# Altium footprint library 2.52-直插元件.PcbLib: 467 footprints (part 11 of 30)
Each footprint in its own frame and in the unit in brackets; x right, y up, seen from the top. Pads: shape width x height; smd on the part's side, far side on the other; paste and mask are expansions set on the pad; w line width, h text height; cw(c..) or ccw(c..) is an arc to the next point about the centre after c.
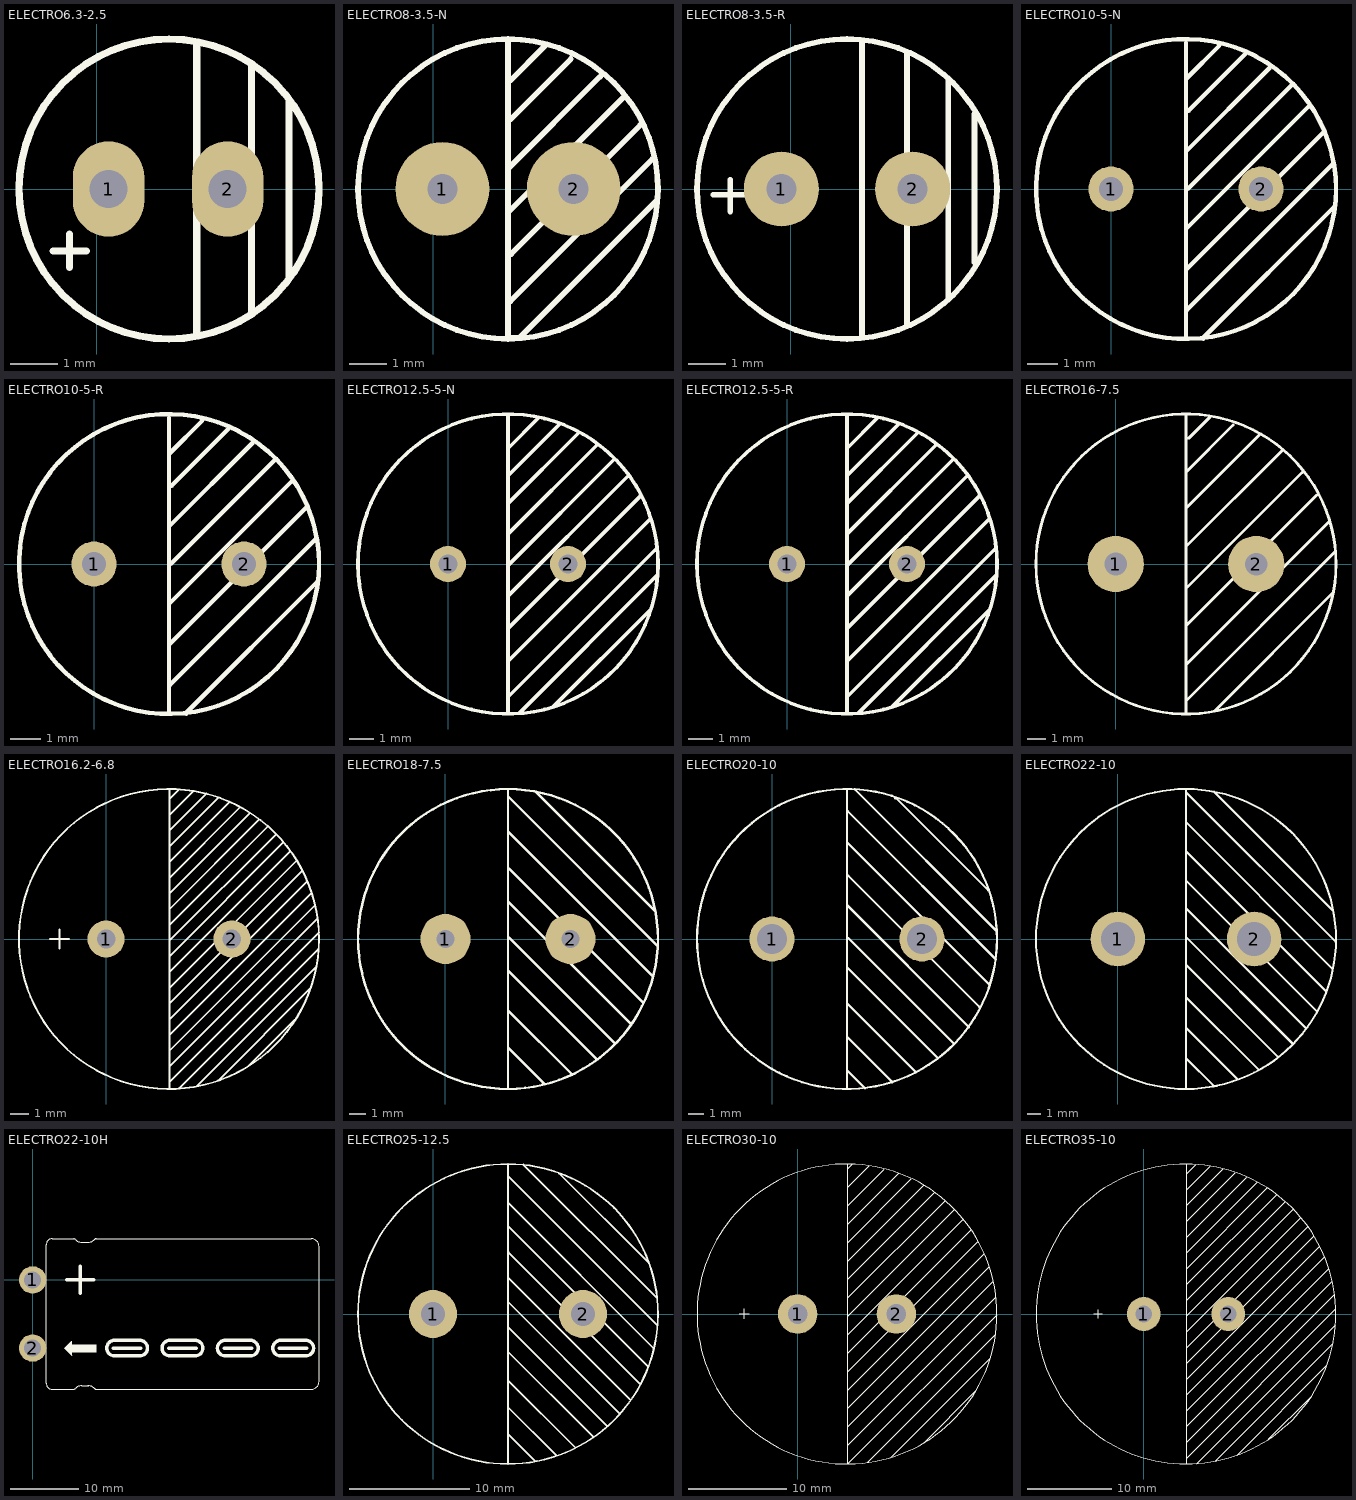
[diagram p10: the footprints below, top view; thin cyan lines are the x and y axes]

## ELECTRO6.3-2.5 [mm]
pads (2):
  oval 1.5x2 hole 0.8: 1(0.25,0) 2(2.75,0)
Top Overlay:
  circle w0.15: c1.518,0 r3.15
  lines w0.15: -0.915,-1.299 -0.215,-1.299 ; -0.568,-1.651 -0.568,-0.951 ; 2.1,-3.073 2.1,3.074 ; 3.25,-2.609 3.25,2.575 ; 4.038,-1.867 4.038,1.851
3D body "Cap-6.step": height 11, standoff -19, extent -1.632,-3.15 4.668,3.15

## ELECTRO8-3.5-N [mm]
pads (2):
  round 2.5 hole 0.8: 1(0.25,0) 2(3.75,0)
Top Overlay:
  circle w0.15: c1.999,0 r3.999
  lines w0.15: 2,-2.984 2.068,-2.984 5.852,0.8 ; 2,-1.735 2.083,-1.735 5.527,1.709 ; 2,-0.645 2,-0.631 5.057,2.426 ; 2,0.508 2,0.54 4.455,2.995 ; 2,1.857 2.068,1.857 3.675,3.465 ; 2,2.896 2.035,2.896 2.068,2.896 2.977,3.805 ; 2,3.966 2,0.02 2,-3.974 2.298,-3.974 5.951,-0.32
3D body "Cap-8x11.5-3.step": height 11.8, standoff -3.71, extent -2.026,-4.025 6.024,4.025

## ELECTRO8-3.5-R [mm]
pads (2):
  round 2 hole 0.8: 1(-0.25,0) 2(3.25,0)
Top Overlay:
  circle w0.15: c1.5,0 r4
  lines w0.15: -2.068,-0.15 -1.218,-0.15 ; -1.618,-0.6 -1.618,0.25 ; 1.9,-3.9 1.9,3.9 ; 3.1,-3.6 3.1,3.65 ; 4.2,-2.95 4.2,2.95 ; 4.9,-1.95 4.9,2
3D body "User_Library-CAP_8X11_5.step": height 11.54, standoff -18.95, extent -2.5,-4 5.5,4

## ELECTRO10-5-N [mm]
pads (2):
  round 1.5 hole 0.8: 1(0,0) 2(5,0)
Top Overlay:
  circle w0.15: c2.5,0 r5
  lines w0.15: 2.5,-4.918 2.5,0 ; 2.5,-4.034 2.525,-4.034 7.389,0.831 ; 2.5,-2.703 2.5,-2.687 7.087,1.9 ; 2.5,-1.491 2.5,-1.335 6.584,2.748 ; 2.5,1.194 2.5,1.248 5.291,4.039 ; 2.5,2.606 2.586,2.606 4.483,4.503 ; 2.5,3.696 2.525,3.696 3.614,4.785 ; 2.5,4.883 2.5,0 ; 3.071,-4.983 3.071,-4.963 7.45,-0.584 ; 6.017,3.454 2.563,0 2.5,0
3D body "User_Library-Cap_electro_10x12_5x5_0mm.step": height 12.78, standoff -3.73, extent -2.525,-5.025 7.525,5.025

## ELECTRO10-5-R [mm]
pads (2):
  round 1.5 hole 0.8: 1(0,0) 2(5,0)
Top Overlay:
  circle w0.15: c2.5,0 r5
  lines w0.15: 2.5,-4.918 2.5,0 ; 2.5,-4.034 2.525,-4.034 7.389,0.831 ; 2.5,-2.703 2.5,-2.687 7.087,1.9 ; 2.5,-1.491 2.5,-1.335 6.584,2.748 ; 2.5,1.194 2.5,1.248 5.291,4.039 ; 2.5,2.606 2.586,2.606 4.483,4.503 ; 2.5,3.696 2.525,3.696 3.614,4.785 ; 2.5,4.883 2.5,0 ; 3.071,-4.983 3.071,-4.963 7.45,-0.584 ; 6.017,3.454 2.563,0 2.5,0
3D body "User_Library-CAP_10X20.step": height 20.24, standoff -18.75, extent -2.5,-5 7.5,5

## ELECTRO12.5-5-N [mm]
pads (2):
  round 1.5 hole 0.8: 1(0,0) 2(5,0)
Top Overlay:
  circle w0.15: c2.5,0 r6.25
  lines w0.15: 2.5,-6.22 2.5,0 ; 2.5,-4.034 2.525,-4.034 8.43,1.872 ; 2.5,-2.703 2.5,-2.687 8.02,2.834 ; 2.5,-1.491 2.5,-1.335 7.516,3.681 ; 2.5,1.194 2.5,1.248 6.201,4.948 ; 2.5,3.696 2.525,3.696 4.661,5.831 ; 2.5,6.237 2.5,0 ; 2.502,2.522 5.404,5.425 ; 2.505,4.826 3.769,6.091 ; 2.528,-5.506 8.695,0.661 ; 2.999,-6.186 8.703,-0.482 ; 4.397,-5.939 8.456,-1.879 ; 6.88,4.318 2.563,0 2.5,0
3D body "Cap-12.5-25.step": height 25.09, standoff -18.9, extent -3.75,-6.25 8.75,6.25

## ELECTRO12.5-5-R [mm] "淘宝ID:黄晶宝石   店铺网址:https://shop463601444.taobao.com"
pads (2):
  round 1.5 hole 0.8: 1(0,0) 2(5,0)
Top Overlay:
  circle w0.15: c2.5,0 r6.25
  lines w0.15: 2.5,-6.22 2.5,0 ; 2.5,-4.034 2.525,-4.034 8.43,1.872 ; 2.5,-2.703 2.5,-2.687 8.02,2.834 ; 2.5,-1.491 2.5,-1.335 7.516,3.681 ; 2.5,1.194 2.5,1.248 6.201,4.948 ; 2.5,3.696 2.525,3.696 4.661,5.831 ; 2.5,6.237 2.5,0 ; 2.502,2.522 5.404,5.425 ; 2.505,4.826 3.769,6.091 ; 2.528,-5.506 8.695,0.661 ; 2.999,-6.186 8.703,-0.482 ; 4.397,-5.939 8.456,-1.879 ; 6.88,4.318 2.563,0 2.5,0
3D body "Cap-12.5-20.step": height 20.09, standoff -18.9, extent -3.75,-6.25 8.75,6.25

## ELECTRO16-7.5 [mm] "淘宝ID:黄晶宝石   店铺网址:https://shop463601444.taobao.com"
pads (2):
  round 3 hole 1.2: 1(0,0) 2(7.5,-0.002)
Top Overlay:
  circle w0.15: c3.75,0 r8
  lines w0.15: 3.75,-7.896 3.75,0 3.75,7.937 ; 3.75,-7.244 3.801,-7.244 11.673,0.627 ; 3.75,-5.451 3.75,-5.375 11.353,2.228 ; 3.75,-3.373 3.75,-3.295 10.713,3.668 ; 3.75,-1.389 3.75,-1.314 9.946,4.882 ; 3.75,0.884 3.75,0.929 8.856,6.035 ; 3.75,2.804 3.75,2.974 7.642,6.866 ; 3.75,4.818 3.75,4.897 6.265,7.412 ; 3.75,6.706 3.799,6.706 3.898,6.706 5.018,7.826 ; 5.241,-7.851 5.272,-7.851 11.543,-1.58
3D body "Cap-16x25.step": height 25.01, standoff -18.99, extent -4.25,-8 11.75,8

## ELECTRO16.2-6.8 [mm] "淘宝ID:黄晶宝石   店铺网址:https://shop463601444.taobao.com"
pads (2):
  round 2 hole 1: 1(0,0) 2(6.8,0)
Top Overlay:
  circle w0.1: c3.4,0 r8.1
  lines w0.1: -3.025,-0.004 -2.009,-0.004 ; -2.517,-0.512 -2.517,0.504 ; 3.43,-8.099 3.434,-8.095 3.434,8.1 ; 3.434,-7.719 10.299,-0.854 11.491,0.338 11.491,0.354 ; 3.434,-6.87 11.422,1.119 ; 3.434,-6.021 11.29,1.835 ; 3.434,-5.172 11.106,2.5 ; 3.434,-4.323 10.876,3.12 ; 3.434,-3.474 10.605,3.698 ; 3.434,-2.625 10.299,4.24 ; 3.434,-1.776 9.95,4.741 ; 3.434,-0.927 9.577,5.216 ; 3.434,-0.078 9.179,5.668 ; 3.434,0.771 8.738,6.076 ; 3.434,1.62 8.277,6.463 ; 3.434,2.469 7.777,6.813 ; 3.434,3.318 7.243,7.127 ; 3.434,4.167 6.674,7.408 ; 3.434,5.016 6.051,7.634 ; 3.434,5.865 5.417,7.848 ; 3.434,6.713 4.709,7.988 ; 3.434,7.562 3.951,8.079 ; 3.92,-8.081 11.479,-0.522 ; 4.915,-7.936 11.349,-1.502 ; 6.049,-7.65 11.039,-2.66 ; 7.71,-6.847 10.193,-4.364
3D body "User Library-CE_R300_D650_H1000.step": height 26.1, standoff -2.8, extent -4.841,-8.23 11.641,8.23

## ELECTRO18-7.5 [mm]
pads (2):
  round 3 hole 1.1: 1(0,0) 2(7.5,0)
Top Overlay:
  lines w0.15: 3.75,-8.992 3.75,8.999 ; 3.75,-6.436 3.75,-6.511 5.951,-8.712 ; 3.75,-4.204 3.75,-4.279 7.604,-8.132 ; 3.75,-1.773 3.75,-1.886 9.086,-7.222 ; 3.75,0.061 3.838,0.061 10.179,-6.28 ; 3.75,2.294 3.75,2.259 11.12,-5.11 ; 3.75,4.209 3.835,4.209 11.875,-3.832 ; 3.75,6.599 3.75,6.445 12.444,-2.249 ; 3.75,8.514 3.794,8.514 12.721,-0.413 ; 5.432,8.832 12.582,1.683 ; 12.75,-0.009 cw(c3.75,0) 12.75,0
3D body "电?": height 25.82, standoff -3.94, extent -5.191,-9 12.738,9
3D body "电?": height 35.82, standoff 6.06, extent -5.191,-9 12.738,9

## ELECTRO20-10 [mm]
pads (2):
  round 3 hole 2: 1(0,0) 2(10,0)
Top Overlay:
  lines w0.15: 5,-9.978 5,9.949 ; 5,-8.669 5,-8.747 6.2,-9.947 ; 5,-6.436 5,-6.511 8.037,-9.548 ; 5,-4.204 5,-4.279 9.591,-8.87 ; 5,-1.773 5,-1.886 11.067,-7.953 ; 5,0.061 5.088,0.061 12.103,-6.955 ; 5,2.294 5,2.259 13.139,-5.88 ; 5,4.209 5.085,4.209 13.818,-4.524 ; 5,6.599 5,6.445 14.534,-3.089 ; 5,8.514 5.044,8.514 14.933,-1.374 ; 5.524,9.99 14.973,0.541 ; 8.194,9.39 8.275,9.39 14.414,3.251 ; 15,-0.01 cw(c5,0) 15,0
3D body "20-10.STEP": height 1.5, standoff -25.5, extent -5,-10 15,10

## ELECTRO22-10 [mm]
pads (2):
  round 4 hole 2.5: 1(0,0) 2(10,0)
Top Overlay:
  lines w0.15: 5,-11 5,11 ; 5,-8.669 5,-8.747 7.06,-10.806 ; 5,-6.436 5,-6.511 8.778,-10.29 ; 5,-4.204 5,-4.279 10.323,-9.602 ; 5,-1.773 5,-1.886 11.736,-8.621 ; 5,0.061 5.088,0.061 12.81,-7.662 ; 5,2.294 5,2.259 13.801,-6.541 ; 5,4.209 5.085,4.209 14.602,-5.308 ; 5,6.599 5,6.445 15.296,-3.85 ; 5,8.514 5.044,8.514 15.735,-2.177 ; 5,10.751 15.967,-0.216 ; 7.049,10.814 15.735,2.129 ; 16,-0.011 cw(c5,0) 16,0
3D body "22-10.STEP": height 1.5, standoff -25.5, extent -6,-11 16,11

## ELECTRO22-10H [mm]
pads (2):
  round 4 hole 2.5: 1(0,0) 2(0,-10)
Top Overlay:
  region: 9.058,-10.508 9.058,-9.492 5.756,-9.492 5.756,-10.508
  region: 9.312,-10.508 9.312,-9.492 8.296,-9.492 8.296,-10.508
  lines w0.1: 4.851,-10.111 4.851,-9.934 4.892,-9.893 ; 5.421,-10.681 5.421,-9.319 5.437,-9.303 ; 5.635,-9.105 5.645,-9.116 5.645,-10.905 ; 7.354,-15.525 8.102,-15.525 cw(c8.102,-16.935) 9.099,-15.938 ccw(c9.309,-15.728) 9.309,-16.025 40.894,-16.025 ccw(c40.894,-14.919) 42,-14.919 42,4.919 ccw(c40.894,4.919) 40.894,6.025 9.309,6.025 ccw(c9.309,5.728) 9.099,5.938 cw(c8.102,6.935) 8.102,5.525 7.354,5.525 ; 8.212,-15.525 7.207,-15.525 ccw(c7.207,-16.812) 6.297,-15.902 cw(c6,-15.605) 6,-16.025 2.845,-16.025 cw(c2.845,-15.191) 2.011,-15.191 2.011,5.191 cw(c2.845,5.191) 2.845,6.025 6,6.025 cw(c6,5.605) 6.297,5.902 ccw(c7.207,6.812) 7.207,5.525 8.212,5.525
  lines w0.15: 4.963,-10.223 4.963,-9.777 ; 5.097,-10.357 5.097,-9.643 ; 5.226,-10.486 5.226,-9.514 ; 5.365,-10.528 5.365,-9.375 ; 5.531,-10.778 5.531,-9.209 ; 5.756,-10.508 9.312,-10.508 9.312,-9.746 9.312,-9.492 5.756,-9.492 ; 4.74,-10 5.756,-8.984 5.756,-10.762 5.756,-11.016 4.74,-10
  lines w0.5: 4.98,0 6.98,0 ; 6.98,-2 6.98,0 ; 6.98,2 6.98,0 ; 8.98,0 6.98,0 ; 11.824,-10 15.884,-10 ; 19.944,-10 24.004,-10 ; 28.064,-10 32.124,-10 ; 36.184,-10 40.244,-10 ; 12,-11.136 cw(c12,-10) 12,-8.864 15.707,-8.864 cw(c15.707,-10) 15.707,-11.136 12,-11.136 ; 20.12,-11.136 cw(c20.12,-10) 20.12,-8.864 23.827,-8.864 cw(c23.827,-10) 23.827,-11.136 20.12,-11.136 ; 28.24,-11.136 cw(c28.24,-10) 28.24,-8.864 31.947,-8.864 cw(c31.947,-10) 31.947,-11.136 28.24,-11.136 ; 36.36,-11.136 cw(c36.36,-10) 36.36,-8.864 40.067,-8.864 cw(c40.067,-10) 40.067,-11.136 36.36,-11.136
3D body "22-10.STEP": height -0.5, standoff -22.5, extent -0.036,-16 26.964,6
3D body "22-10.STEP": height -0.5, standoff -22.5, extent 15.05,-16 42.05,6
3D body: height 11.08, standoff -5, extent -0.496,-10.499 0.5,-9.501
3D body: height 11.58, standoff 10.58, extent -0.495,-10.498 0.5,-9.502
3D body: height 11.58, standoff 10.58, extent -0.495,-0.498 0.5,0.498
3D body: height 11.08, standoff -5, extent -0.496,-0.499 0.5,0.499

## ELECTRO25-12.5 [mm] "淘宝ID:黄晶宝石   店铺网址:https://shop463601444.taobao.com"
pads (2):
  round 4 hole 2: 1(0,0) 2(12.5,0)
Top Overlay:
  lines w0.15: 6.224,-1.075 14.513,-9.364 ; 6.236,-3.122 13.301,-10.187 ; 6.238,-7.75 10.3,-11.812 ; 6.25,-12.5 6.25,12.5 ; 6.25,1.01 15.556,-8.297 ; 6.256,7.302 17.939,-4.38 ; 6.26,9.255 18.387,-2.872 ; 6.263,11.487 18.7,-0.95 ; 6.266,-10.012 8.494,-12.241 ; 6.268,3.025 16.391,-7.097 ; 6.276,-5.555 11.831,-11.109 ; 6.284,5.161 17.241,-5.796 ; 7.531,12.453 18.678,1.306 ; 10.501,11.719 18.005,4.214 ; 18.75,-0.013 cw(c6.25,0) 18.75,0
3D body "User Library-Cap 25x50.STEP": height 50.05, standoff -18.95, extent -6.25,-12.5 18.75,12.5

## ELECTRO30-10 [mm]
pads (2):
  round 4 hole 2: 1(0,0) 2(10,0)
Top Overlay:
  circle w0.1: c5,0 r15.2
  lines w0.1: -5.909,0.011 -4.893,0.011 ; -5.401,-0.497 -5.401,0.519 ; 5.077,-15.2 5.077,15.2 ; 5.077,-15.178 20.201,-0.055 ; 5.077,-13.31 20.095,1.707 ; 5.077,-11.442 19.83,3.311 ; 5.077,-9.574 19.424,4.773 ; 5.077,-7.706 18.912,6.128 ; 5.077,-5.838 18.29,7.374 ; 5.077,-3.97 17.575,8.528 ; 5.077,-2.102 16.78,9.6 ; 5.077,-0.234 15.874,10.562 ; 5.077,1.634 14.94,11.496 ; 5.077,3.502 13.895,12.319 ; 5.077,5.37 12.759,13.051 ; 5.077,7.238 11.532,13.693 ; 5.077,9.106 10.22,14.249 ; 5.077,10.974 8.796,14.692 ; 5.077,12.842 7.254,15.019 ; 5.077,14.71 5.542,15.175 ; 7.097,-15.027 20.057,-2.066 ; 9.439,-14.552 19.532,-4.46 ; 12.832,-13.027 18.019,-7.841
3D body "User Library-Assy_CE_R400_D1200_H2000.STEP": height 50.8, standoff -6.89, extent -10.24,-15.239 20.24,15.239
3D body "User Library-Assy_CE_R400_D1200_H1450.STEP": height 36.83, standoff -6.89, extent -10.24,-15.237 20.24,15.237

## ELECTRO35-10 [mm]
pads (2):
  round 4 hole 2: 1(0,0) 2(10,0)
Top Overlay:
  circle w0.1: c5,0 r17.75
  lines w0.1: -5.909,0.011 -4.893,0.011 ; -5.401,-0.497 -5.401,0.519 ; 5.074,-17.049 22.744,0.62 ; 5.077,-17.75 5.077,17.75 ; 5.077,-15.178 22.589,2.334 ; 5.077,-13.31 22.287,3.899 ; 5.077,-11.442 21.897,5.377 ; 5.077,-9.574 21.41,6.759 ; 5.077,-7.706 20.819,8.036 ; 5.077,-5.838 20.144,9.229 ; 5.077,-3.97 19.394,10.346 ; 5.077,-2.102 18.58,11.4 ; 5.077,-0.234 17.695,12.384 ; 5.077,1.634 16.732,13.289 ; 5.077,3.502 15.712,14.136 ; 5.077,5.37 14.621,14.913 ; 5.077,7.238 13.444,15.605 ; 5.077,9.106 12.176,16.204 ; 5.077,10.974 10.822,16.719 ; 5.077,12.842 9.411,17.176 ; 5.077,14.71 7.88,17.513 ; 5.077,16.578 6.183,17.684 ; 6.291,-17.7 22.705,-1.286 ; 8.463,-17.396 22.404,-3.455 ; 11.041,-16.687 21.678,-6.049 ; 14.817,-14.779 19.768,-9.828
3D body "User Library-CE_Assy.STEP": height 31, standoff -6.82, extent -12.43,-17.451 22.43,17.451